# Altium footprint library iv_footprints.PcbLib: 724 footprints (part 41 of 46)
Each footprint in its own frame and in the unit in brackets; x right, y up, seen from the top. Pads: shape width x height; smd on the part's side, far side on the other; paste and mask are expansions set on the pad; w line width, h text height; cw(c..) or ccw(c..) is an arc to the next point about the centre after c.
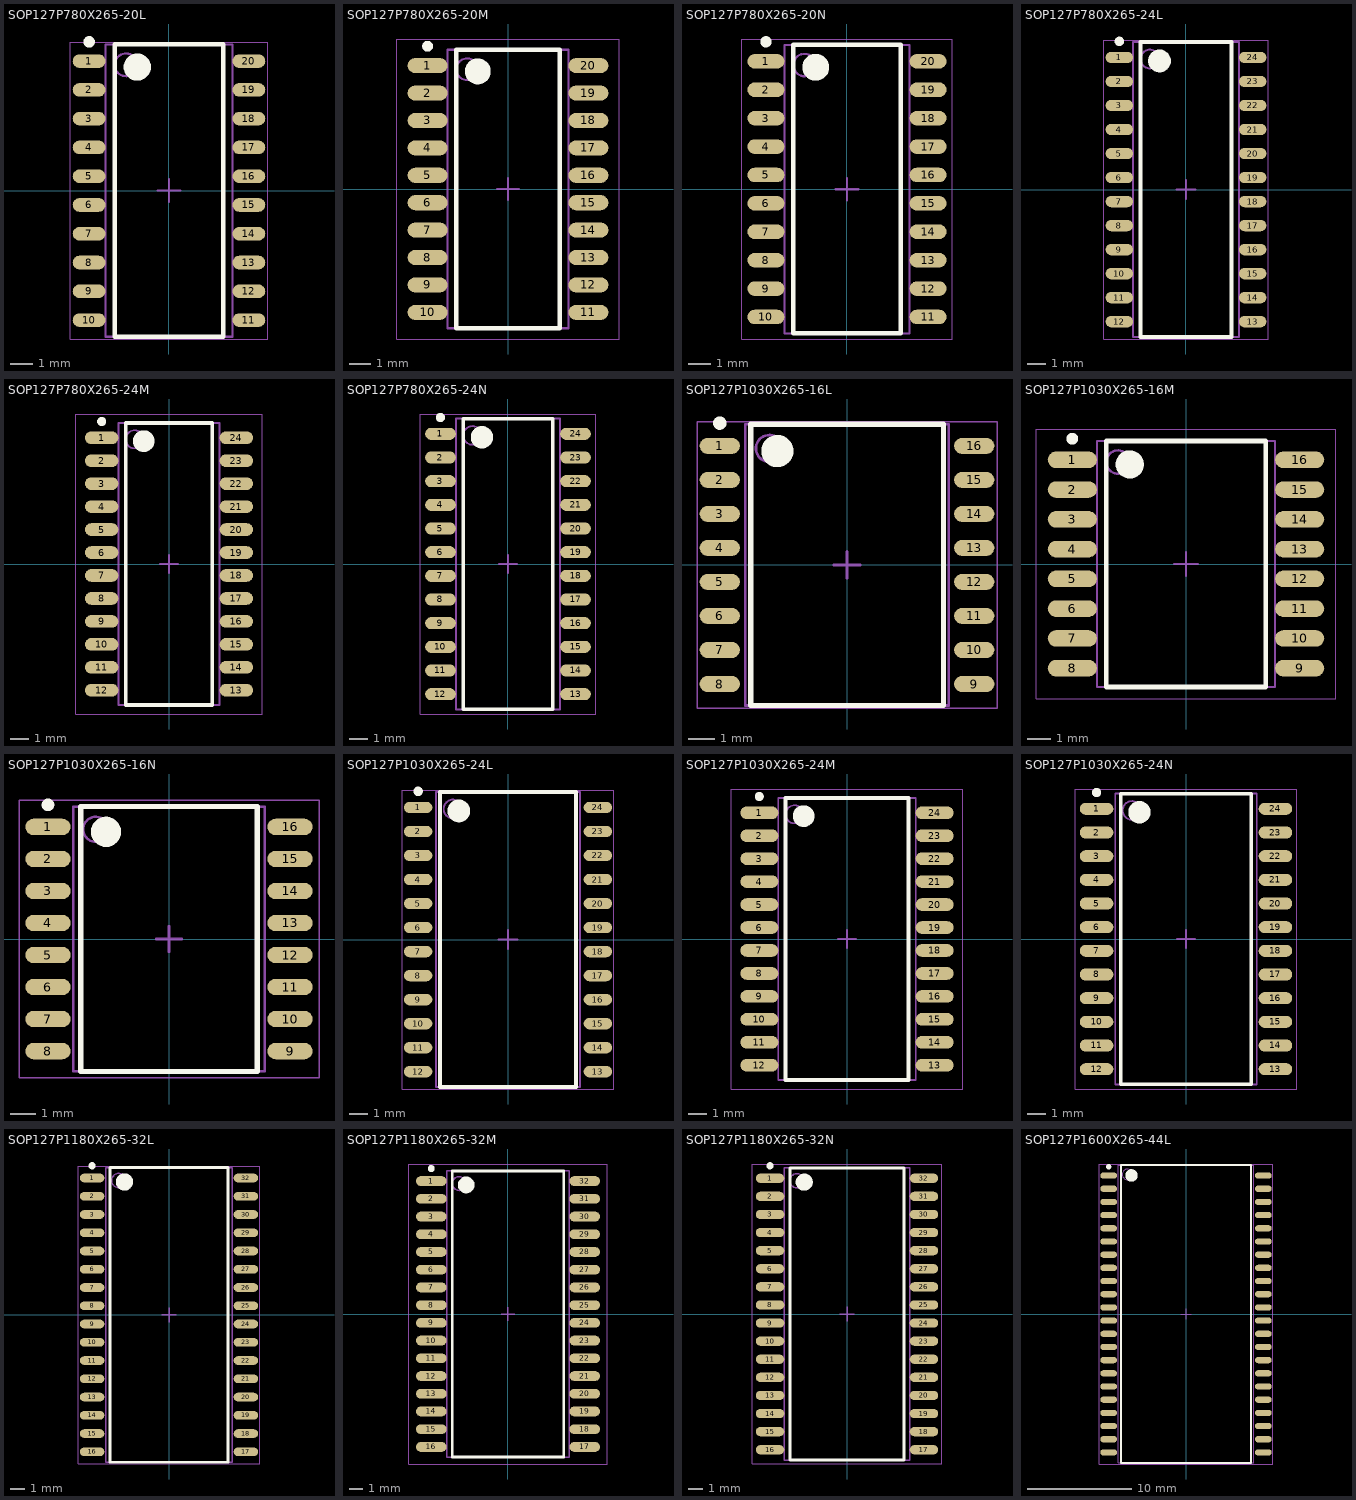
[diagram p40: the footprints below, top view; thin cyan lines are the x and y axes]

## SOP127P780X265-20L [mm] "SOP, 20-Leads, Body 12.70x5.40mm, Pitch 1.27mm, IPC High Density"
height 2.65
pads (20):
  oval 1.45x0.6 smd: 1(-3.525,5.715) 2(-3.525,4.445) 3(-3.525,3.175) 4(-3.525,1.905) 5(-3.525,0.635) 6(-3.525,-0.635) 7(-3.525,-1.905) 8(-3.525,-3.175) 9(-3.525,-4.445) 10(-3.525,-5.715) 11(3.525,-5.715) 12(3.525,-4.445) 13(3.525,-3.175) 14(3.525,-1.905) 15(3.525,-0.635) 16(3.525,0.635) 17(3.525,1.905) 18(3.525,3.175) 19(3.525,4.445) 20(3.525,5.715)
Top Overlay:
  circle w0.25: c-3.525,6.565 r0.125
  circle w0.6: c-1.4,5.45 r0.3
  lines w0.2: -2.4,-6.45 -2.4,6.45 2.4,6.45 2.4,-6.45 -2.4,-6.45
Mechanical 13:
  circle w0.1: c-1.9,5.55 r0.5
  lines w0.1: -2.8,-6.45 -2.8,6.45 2.8,6.45 2.8,-6.45 -2.8,-6.45
Mechanical 15:
  lines w0.05: -4.35,-6.55 -4.35,6.55 4.35,6.55 4.35,-6.55 -4.35,-6.55
  lines w0.1: -0.5,0 0.5,0 ; 0,-0.5 0,0.5
3D body "SOP127P780X265-20L.step": height 2.65, standoff 0, extent -3.9,-6.45 3.9,6.45

## SOP127P780X265-20M [mm] "SOP, 20-Leads, Body 12.70x5.40mm, Pitch 1.27mm, IPC Low Density"
height 2.65
pads (20):
  oval 1.85x0.7 smd: 1(-3.725,5.715) 2(-3.725,4.445) 3(-3.725,3.175) 4(-3.725,1.905) 5(-3.725,0.635) 6(-3.725,-0.635) 7(-3.725,-1.905) 8(-3.725,-3.175) 9(-3.725,-4.445) 10(-3.725,-5.715) 11(3.725,-5.715) 12(3.725,-4.445) 13(3.725,-3.175) 14(3.725,-1.905) 15(3.725,-0.635) 16(3.725,0.635) 17(3.725,1.905) 18(3.725,3.175) 19(3.725,4.445) 20(3.725,5.715)
Top Overlay:
  circle w0.25: c-3.725,6.615 r0.125
  circle w0.6: c-1.4,5.45 r0.3
  lines w0.2: -2.4,-6.45 -2.4,6.45 2.4,6.45 2.4,-6.45 -2.4,-6.45
Mechanical 13:
  circle w0.1: c-1.9,5.55 r0.5
  lines w0.1: -2.8,-6.45 -2.8,6.45 2.8,6.45 2.8,-6.45 -2.8,-6.45
Mechanical 15:
  lines w0.05: -5.15,-6.95 -5.15,6.95 5.15,6.95 5.15,-6.95 -5.15,-6.95
  lines w0.1: -0.5,0 0.5,0 ; 0,-0.5 0,0.5
3D body "SOP127P780X265-20M.step": height 2.65, standoff 0, extent -3.9,-6.45 3.9,6.45

## SOP127P780X265-20N [mm] "SOP, 20-Leads, Body 12.70x5.40mm, Pitch 1.27mm, IPC Medium Density"
height 2.65
pads (20):
  oval 1.65x0.65 smd: 1(-3.625,5.715) 2(-3.625,4.445) 3(-3.625,3.175) 4(-3.625,1.905) 5(-3.625,0.635) 6(-3.625,-0.635) 7(-3.625,-1.905) 8(-3.625,-3.175) 9(-3.625,-4.445) 10(-3.625,-5.715) 11(3.625,-5.715) 12(3.625,-4.445) 13(3.625,-3.175) 14(3.625,-1.905) 15(3.625,-0.635) 16(3.625,0.635) 17(3.625,1.905) 18(3.625,3.175) 19(3.625,4.445) 20(3.625,5.715)
Top Overlay:
  circle w0.25: c-3.625,6.59 r0.125
  circle w0.6: c-1.4,5.45 r0.3
  lines w0.2: -2.4,-6.45 -2.4,6.45 2.4,6.45 2.4,-6.45 -2.4,-6.45
Mechanical 13:
  circle w0.1: c-1.9,5.55 r0.5
  lines w0.1: -2.8,-6.45 -2.8,6.45 2.8,6.45 2.8,-6.45 -2.8,-6.45
Mechanical 15:
  lines w0.05: -4.7,-6.7 -4.7,6.7 4.7,6.7 4.7,-6.7 -4.7,-6.7
  lines w0.1: -0.5,0 0.5,0 ; 0,-0.5 0,0.5
3D body "SOP127P780X265-20N.step": height 2.65, standoff 0, extent -3.9,-6.45 3.9,6.45

## SOP127P780X265-24L [mm] "SOP, 24-Leads, Body 15.40x5.40mm, Pitch 1.27mm, IPC High Density"
height 2.65
pads (24):
  oval 1.45x0.6 smd: 1(-3.525,6.985) 2(-3.525,5.715) 3(-3.525,4.445) 4(-3.525,3.175) 5(-3.525,1.905) 6(-3.525,0.635) 7(-3.525,-0.635) 8(-3.525,-1.905) 9(-3.525,-3.175) 10(-3.525,-4.445) 11(-3.525,-5.715) 12(-3.525,-6.985) 13(3.525,-6.985) 14(3.525,-5.715) 15(3.525,-4.445) 16(3.525,-3.175) 17(3.525,-1.905) 18(3.525,-0.635) 19(3.525,0.635) 20(3.525,1.905) 21(3.525,3.175) 22(3.525,4.445) 23(3.525,5.715) 24(3.525,6.985)
Top Overlay:
  circle w0.25: c-3.525,7.835 r0.125
  circle w0.6: c-1.4,6.8 r0.3
  lines w0.2: -2.4,-7.8 -2.4,7.8 2.4,7.8 2.4,-7.8 -2.4,-7.8
Mechanical 13:
  circle w0.1: c-1.9,6.9 r0.5
  lines w0.1: -2.8,-7.8 -2.8,7.8 2.8,7.8 2.8,-7.8 -2.8,-7.8
Mechanical 15:
  lines w0.05: -4.35,-7.9 -4.35,7.9 4.35,7.9 4.35,-7.9 -4.35,-7.9
  lines w0.1: -0.5,0 0.5,0 ; 0,-0.5 0,0.5
3D body "SOP127P780X265-24L.step": height 2.65, standoff 0, extent -3.9,-7.8 3.9,7.8

## SOP127P780X265-24M [mm] "SOP, 24-Leads, Body 15.40x5.40mm, Pitch 1.27mm, IPC Low Density"
height 2.65
pads (24):
  oval 1.85x0.7 smd: 1(-3.725,6.985) 2(-3.725,5.715) 3(-3.725,4.445) 4(-3.725,3.175) 5(-3.725,1.905) 6(-3.725,0.635) 7(-3.725,-0.635) 8(-3.725,-1.905) 9(-3.725,-3.175) 10(-3.725,-4.445) 11(-3.725,-5.715) 12(-3.725,-6.985) 13(3.725,-6.985) 14(3.725,-5.715) 15(3.725,-4.445) 16(3.725,-3.175) 17(3.725,-1.905) 18(3.725,-0.635) 19(3.725,0.635) 20(3.725,1.905) 21(3.725,3.175) 22(3.725,4.445) 23(3.725,5.715) 24(3.725,6.985)
Top Overlay:
  circle w0.25: c-3.725,7.885 r0.125
  circle w0.6: c-1.4,6.8 r0.3
  lines w0.2: -2.4,-7.8 -2.4,7.8 2.4,7.8 2.4,-7.8 -2.4,-7.8
Mechanical 13:
  circle w0.1: c-1.9,6.9 r0.5
  lines w0.1: -2.8,-7.8 -2.8,7.8 2.8,7.8 2.8,-7.8 -2.8,-7.8
Mechanical 15:
  lines w0.05: -5.15,-8.3 -5.15,8.3 5.15,8.3 5.15,-8.3 -5.15,-8.3
  lines w0.1: -0.5,0 0.5,0 ; 0,-0.5 0,0.5
3D body "SOP127P780X265-24M.step": height 2.65, standoff 0, extent -3.9,-7.8 3.9,7.8

## SOP127P780X265-24N [mm] "SOP, 24-Leads, Body 15.40x5.40mm, Pitch 1.27mm, IPC Medium Density"
height 2.65
pads (24):
  oval 1.65x0.65 smd: 1(-3.625,6.985) 2(-3.625,5.715) 3(-3.625,4.445) 4(-3.625,3.175) 5(-3.625,1.905) 6(-3.625,0.635) 7(-3.625,-0.635) 8(-3.625,-1.905) 9(-3.625,-3.175) 10(-3.625,-4.445) 11(-3.625,-5.715) 12(-3.625,-6.985) 13(3.625,-6.985) 14(3.625,-5.715) 15(3.625,-4.445) 16(3.625,-3.175) 17(3.625,-1.905) 18(3.625,-0.635) 19(3.625,0.635) 20(3.625,1.905) 21(3.625,3.175) 22(3.625,4.445) 23(3.625,5.715) 24(3.625,6.985)
Top Overlay:
  circle w0.25: c-3.625,7.86 r0.125
  circle w0.6: c-1.4,6.8 r0.3
  lines w0.2: -2.4,-7.8 -2.4,7.8 2.4,7.8 2.4,-7.8 -2.4,-7.8
Mechanical 13:
  circle w0.1: c-1.9,6.9 r0.5
  lines w0.1: -2.8,-7.8 -2.8,7.8 2.8,7.8 2.8,-7.8 -2.8,-7.8
Mechanical 15:
  lines w0.05: -4.7,-8.05 -4.7,8.05 4.7,8.05 4.7,-8.05 -4.7,-8.05
  lines w0.1: -0.5,0 0.5,0 ; 0,-0.5 0,0.5
3D body "SOP127P780X265-24N.step": height 2.65, standoff 0, extent -3.9,-7.8 3.9,7.8

## SOP127P1030X265-16L [mm] "SOP, 16-Leads, Body 10.30x7.50mm, Pitch 1.27mm, IPC High Density"
height 2.65
pads (16):
  oval 1.5x0.6 smd: 1(-4.75,4.445) 2(-4.75,3.175) 3(-4.75,1.905) 4(-4.75,0.635) 5(-4.75,-0.635) 6(-4.75,-1.905) 7(-4.75,-3.175) 8(-4.75,-4.445) 9(4.75,-4.445) 10(4.75,-3.175) 11(4.75,-1.905) 12(4.75,-0.635) 13(4.75,0.635) 14(4.75,1.905) 15(4.75,3.175) 16(4.75,4.445)
Top Overlay:
  circle w0.25: c-4.75,5.295 r0.125
  circle w0.6: c-2.6,4.25 r0.3
  lines w0.2: -3.6,-5.25 -3.6,5.25 3.6,5.25 3.6,-5.25 -3.6,-5.25
Mechanical 13:
  circle w0.1: c-2.9,4.35 r0.5
  lines w0.1: -3.8,-5.25 -3.8,5.25 3.8,5.25 3.8,-5.25 -3.8,-5.25
Mechanical 15:
  lines w0.05: -5.6,-5.35 -5.6,5.35 5.6,5.35 5.6,-5.35 -5.6,-5.35
  lines w0.1: -0.5,0 0.5,0 ; 0,-0.5 0,0.5
3D body "SOP127P1030X265-16L.step": height 2.65, standoff 0, extent -5.15,-5.25 5.15,5.25

## SOP127P1030X265-16M [mm] "SOP, 16-Leads, Body 10.30x7.50mm, Pitch 1.27mm, IPC Low Density"
height 2.65
pads (16):
  oval 2.1x0.7 smd: 1(-4.85,4.445) 2(-4.85,3.175) 3(-4.85,1.905) 4(-4.85,0.635) 5(-4.85,-0.635) 6(-4.85,-1.905) 7(-4.85,-3.175) 8(-4.85,-4.445) 9(4.85,-4.445) 10(4.85,-3.175) 11(4.85,-1.905) 12(4.85,-0.635) 13(4.85,0.635) 14(4.85,1.905) 15(4.85,3.175) 16(4.85,4.445)
Top Overlay:
  circle w0.25: c-4.85,5.345 r0.125
  circle w0.6: c-2.4,4.25 r0.3
  lines w0.2: -3.4,-5.25 -3.4,5.25 3.4,5.25 3.4,-5.25 -3.4,-5.25
Mechanical 13:
  circle w0.1: c-2.9,4.35 r0.5
  lines w0.1: -3.8,-5.25 -3.8,5.25 3.8,5.25 3.8,-5.25 -3.8,-5.25
Mechanical 15:
  lines w0.05: -6.4,-5.75 -6.4,5.75 6.4,5.75 6.4,-5.75 -6.4,-5.75
  lines w0.1: -0.5,0 0.5,0 ; 0,-0.5 0,0.5
3D body "SOP127P1030X265-16M.step": height 2.65, standoff 0, extent -5.15,-5.25 5.15,5.25

## SOP127P1030X265-16N [mm] "SOP, 16-Leads, Body 10.30x7.50mm, Pitch 1.27mm, IPC Medium Density"
height 2.65
pads (16):
  oval 1.8x0.65 smd: 1(-4.8,4.445) 2(-4.8,3.175) 3(-4.8,1.905) 4(-4.8,0.635) 5(-4.8,-0.635) 6(-4.8,-1.905) 7(-4.8,-3.175) 8(-4.8,-4.445) 9(4.8,-4.445) 10(4.8,-3.175) 11(4.8,-1.905) 12(4.8,-0.635) 13(4.8,0.635) 14(4.8,1.905) 15(4.8,3.175) 16(4.8,4.445)
Top Overlay:
  circle w0.25: c-4.8,5.32 r0.125
  circle w0.6: c-2.5,4.25 r0.3
  lines w0.2: -3.5,-5.25 -3.5,5.25 3.5,5.25 3.5,-5.25 -3.5,-5.25
Mechanical 13:
  circle w0.1: c-2.9,4.35 r0.5
  lines w0.1: -3.8,-5.25 -3.8,5.25 3.8,5.25 3.8,-5.25 -3.8,-5.25
Mechanical 15:
  lines w0.05: -5.95,-5.5 -5.95,5.5 5.95,5.5 5.95,-5.5 -5.95,-5.5
  lines w0.1: -0.5,0 0.5,0 ; 0,-0.5 0,0.5
3D body "SOP127P1030X265-16N.step": height 2.65, standoff 0, extent -5.15,-5.25 5.15,5.25

## SOP127P1030X265-24L [mm] "SOP, 24-Leads, Body 15.40x7.50mm, Pitch 1.27mm, IPC High Density"
height 2.65
pads (24):
  oval 1.5x0.6 smd: 1(-4.75,6.985) 2(-4.75,5.715) 3(-4.75,4.445) 4(-4.75,3.175) 5(-4.75,1.905) 6(-4.75,0.635) 7(-4.75,-0.635) 8(-4.75,-1.905) 9(-4.75,-3.175) 10(-4.75,-4.445) 11(-4.75,-5.715) 12(-4.75,-6.985) 13(4.75,-6.985) 14(4.75,-5.715) 15(4.75,-4.445) 16(4.75,-3.175) 17(4.75,-1.905) 18(4.75,-0.635) 19(4.75,0.635) 20(4.75,1.905) 21(4.75,3.175) 22(4.75,4.445) 23(4.75,5.715) 24(4.75,6.985)
Top Overlay:
  circle w0.25: c-4.75,7.835 r0.125
  circle w0.6: c-2.6,6.8 r0.3
  lines w0.2: -3.6,-7.8 -3.6,7.8 3.6,7.8 3.6,-7.8 -3.6,-7.8
Mechanical 13:
  circle w0.1: c-2.9,6.9 r0.5
  lines w0.1: -3.8,-7.8 -3.8,7.8 3.8,7.8 3.8,-7.8 -3.8,-7.8
Mechanical 15:
  lines w0.05: -5.6,-7.9 -5.6,7.9 5.6,7.9 5.6,-7.9 -5.6,-7.9
  lines w0.1: -0.5,0 0.5,0 ; 0,-0.5 0,0.5
3D body "SOP127P1030X265-24L.step": height 2.65, standoff 0, extent -5.15,-7.8 5.15,7.8

## SOP127P1030X265-24M [mm] "SOP, 24-Leads, Body 15.40x7.50mm, Pitch 1.27mm, IPC Low Density"
height 2.65
pads (24):
  oval 2.1x0.7 smd: 1(-4.85,6.985) 2(-4.85,5.715) 3(-4.85,4.445) 4(-4.85,3.175) 5(-4.85,1.905) 6(-4.85,0.635) 7(-4.85,-0.635) 8(-4.85,-1.905) 9(-4.85,-3.175) 10(-4.85,-4.445) 11(-4.85,-5.715) 12(-4.85,-6.985) 13(4.85,-6.985) 14(4.85,-5.715) 15(4.85,-4.445) 16(4.85,-3.175) 17(4.85,-1.905) 18(4.85,-0.635) 19(4.85,0.635) 20(4.85,1.905) 21(4.85,3.175) 22(4.85,4.445) 23(4.85,5.715) 24(4.85,6.985)
Top Overlay:
  circle w0.25: c-4.85,7.885 r0.125
  circle w0.6: c-2.4,6.8 r0.3
  lines w0.2: -3.4,-7.8 -3.4,7.8 3.4,7.8 3.4,-7.8 -3.4,-7.8
Mechanical 13:
  circle w0.1: c-2.9,6.9 r0.5
  lines w0.1: -3.8,-7.8 -3.8,7.8 3.8,7.8 3.8,-7.8 -3.8,-7.8
Mechanical 15:
  lines w0.05: -6.4,-8.3 -6.4,8.3 6.4,8.3 6.4,-8.3 -6.4,-8.3
  lines w0.1: -0.5,0 0.5,0 ; 0,-0.5 0,0.5
3D body "SOP127P1030X265-24M.step": height 2.65, standoff 0, extent -5.15,-7.8 5.15,7.8

## SOP127P1030X265-24N [mm] "SOP, 24-Leads, Body 15.40x7.50mm, Pitch 1.27mm, IPC Medium Density"
height 2.65
pads (24):
  oval 1.8x0.65 smd: 1(-4.8,6.985) 2(-4.8,5.715) 3(-4.8,4.445) 4(-4.8,3.175) 5(-4.8,1.905) 6(-4.8,0.635) 7(-4.8,-0.635) 8(-4.8,-1.905) 9(-4.8,-3.175) 10(-4.8,-4.445) 11(-4.8,-5.715) 12(-4.8,-6.985) 13(4.8,-6.985) 14(4.8,-5.715) 15(4.8,-4.445) 16(4.8,-3.175) 17(4.8,-1.905) 18(4.8,-0.635) 19(4.8,0.635) 20(4.8,1.905) 21(4.8,3.175) 22(4.8,4.445) 23(4.8,5.715) 24(4.8,6.985)
Top Overlay:
  circle w0.25: c-4.8,7.86 r0.125
  circle w0.6: c-2.5,6.8 r0.3
  lines w0.2: -3.5,-7.8 -3.5,7.8 3.5,7.8 3.5,-7.8 -3.5,-7.8
Mechanical 13:
  circle w0.1: c-2.9,6.9 r0.5
  lines w0.1: -3.8,-7.8 -3.8,7.8 3.8,7.8 3.8,-7.8 -3.8,-7.8
Mechanical 15:
  lines w0.05: -5.95,-8.05 -5.95,8.05 5.95,8.05 5.95,-8.05 -5.95,-8.05
  lines w0.1: -0.5,0 0.5,0 ; 0,-0.5 0,0.5
3D body "SOP127P1030X265-24N.step": height 2.65, standoff 0, extent -5.15,-7.8 5.15,7.8

## SOP127P1180X265-32L [mm] "SOP, 32-Leads, Body 20.30x8.60mm, Pitch 1.27mm, IPC High Density"
height 2.65
pads (32):
  oval 1.7x0.6 smd: 1(-5.35,9.525) 2(-5.35,8.255) 3(-5.35,6.985) 4(-5.35,5.715) 5(-5.35,4.445) 6(-5.35,3.175) 7(-5.35,1.905) 8(-5.35,0.635) 9(-5.35,-0.635) 10(-5.35,-1.905) 11(-5.35,-3.175) 12(-5.35,-4.445) 13(-5.35,-5.715) 14(-5.35,-6.985) 15(-5.35,-8.255) 16(-5.35,-9.525) 17(5.35,-9.525) 18(5.35,-8.255) 19(5.35,-6.985) 20(5.35,-5.715) 21(5.35,-4.445) 22(5.35,-3.175) 23(5.35,-1.905) 24(5.35,-0.635) 25(5.35,0.635) 26(5.35,1.905) 27(5.35,3.175) 28(5.35,4.445) 29(5.35,5.715) 30(5.35,6.985) 31(5.35,8.255) 32(5.35,9.525)
Top Overlay:
  circle w0.25: c-5.35,10.375 r0.125
  circle w0.6: c-3.1,9.25 r0.3
  lines w0.2: -4.1,-10.25 -4.1,10.25 4.1,10.25 4.1,-10.25 -4.1,-10.25
Mechanical 13:
  circle w0.1: c-3.5,9.35 r0.5
  lines w0.1: -4.4,-10.25 -4.4,10.25 4.4,10.25 4.4,-10.25 -4.4,-10.25
Mechanical 15:
  lines w0.05: -6.3,-10.35 -6.3,10.35 6.3,10.35 6.3,-10.35 -6.3,-10.35
  lines w0.1: -0.5,0 0.5,0 ; 0,-0.5 0,0.5
3D body "SOP127P1180X265-32L.step": height 2.65, standoff 0, extent -5.9,-10.25 5.9,10.25

## SOP127P1180X265-32M [mm] "SOP, 32-Leads, Body 20.30x8.60mm, Pitch 1.27mm, IPC Low Density"
height 2.65
pads (32):
  oval 2.2x0.7 smd: 1(-5.5,9.525) 2(-5.5,8.255) 3(-5.5,6.985) 4(-5.5,5.715) 5(-5.5,4.445) 6(-5.5,3.175) 7(-5.5,1.905) 8(-5.5,0.635) 9(-5.5,-0.635) 10(-5.5,-1.905) 11(-5.5,-3.175) 12(-5.5,-4.445) 13(-5.5,-5.715) 14(-5.5,-6.985) 15(-5.5,-8.255) 16(-5.5,-9.525) 17(5.5,-9.525) 18(5.5,-8.255) 19(5.5,-6.985) 20(5.5,-5.715) 21(5.5,-4.445) 22(5.5,-3.175) 23(5.5,-1.905) 24(5.5,-0.635) 25(5.5,0.635) 26(5.5,1.905) 27(5.5,3.175) 28(5.5,4.445) 29(5.5,5.715) 30(5.5,6.985) 31(5.5,8.255) 32(5.5,9.525)
Top Overlay:
  circle w0.25: c-5.5,10.425 r0.125
  circle w0.6: c-3,9.25 r0.3
  lines w0.2: -4,-10.25 -4,10.25 4,10.25 4,-10.25 -4,-10.25
Mechanical 13:
  circle w0.1: c-3.5,9.35 r0.5
  lines w0.1: -4.4,-10.25 -4.4,10.25 4.4,10.25 4.4,-10.25 -4.4,-10.25
Mechanical 15:
  lines w0.05: -7.1,-10.75 -7.1,10.75 7.1,10.75 7.1,-10.75 -7.1,-10.75
  lines w0.1: -0.5,0 0.5,0 ; 0,-0.5 0,0.5
3D body "SOP127P1180X265-32M.step": height 2.65, standoff 0, extent -5.9,-10.25 5.9,10.25

## SOP127P1180X265-32N [mm] "SOP, 32-Leads, Body 20.30x8.60mm, Pitch 1.27mm, IPC Medium Density"
height 2.65
pads (32):
  oval 2x0.65 smd: 1(-5.4,9.525) 2(-5.4,8.255) 3(-5.4,6.985) 4(-5.4,5.715) 5(-5.4,4.445) 6(-5.4,3.175) 7(-5.4,1.905) 8(-5.4,0.635) 9(-5.4,-0.635) 10(-5.4,-1.905) 11(-5.4,-3.175) 12(-5.4,-4.445) 13(-5.4,-5.715) 14(-5.4,-6.985) 15(-5.4,-8.255) 16(-5.4,-9.525) 17(5.4,-9.525) 18(5.4,-8.255) 19(5.4,-6.985) 20(5.4,-5.715) 21(5.4,-4.445) 22(5.4,-3.175) 23(5.4,-1.905) 24(5.4,-0.635) 25(5.4,0.635) 26(5.4,1.905) 27(5.4,3.175) 28(5.4,4.445) 29(5.4,5.715) 30(5.4,6.985) 31(5.4,8.255) 32(5.4,9.525)
Top Overlay:
  circle w0.25: c-5.4,10.4 r0.125
  circle w0.6: c-3,9.25 r0.3
  lines w0.2: -4,-10.25 -4,10.25 4,10.25 4,-10.25 -4,-10.25
Mechanical 13:
  circle w0.1: c-3.5,9.35 r0.5
  lines w0.1: -4.4,-10.25 -4.4,10.25 4.4,10.25 4.4,-10.25 -4.4,-10.25
Mechanical 15:
  lines w0.05: -6.65,-10.5 -6.65,10.5 6.65,10.5 6.65,-10.5 -6.65,-10.5
  lines w0.1: -0.5,0 0.5,0 ; 0,-0.5 0,0.5
3D body "SOP127P1180X265-32N.step": height 2.65, standoff 0, extent -5.9,-10.25 5.9,10.25

## SOP127P1600X265-44L [mm] "SOP, 44-Leads, Body 28.45x13.00mm, Pitch 1.27mm, IPC High Density"
height 2.65
pads (44):
  oval 1.6x0.6 smd: 1(-7.45,13.335) 2(-7.45,12.065) 3(-7.45,10.795) 4(-7.45,9.525) 5(-7.45,8.255) 6(-7.45,6.985) 7(-7.45,5.715) 8(-7.45,4.445) 9(-7.45,3.175) 10(-7.45,1.905) 11(-7.45,0.635) 12(-7.45,-0.635) 13(-7.45,-1.905) 14(-7.45,-3.175) 15(-7.45,-4.445) 16(-7.45,-5.715) 17(-7.45,-6.985) 18(-7.45,-8.255) 19(-7.45,-9.525) 20(-7.45,-10.795) 21(-7.45,-12.065) 22(-7.45,-13.335) 23(7.45,-13.335) 24(7.45,-12.065) 25(7.45,-10.795) 26(7.45,-9.525) 27(7.45,-8.255) 28(7.45,-6.985) 29(7.45,-5.715) 30(7.45,-4.445) 31(7.45,-3.175) 32(7.45,-1.905) 33(7.45,-0.635) 34(7.45,0.635) 35(7.45,1.905) 36(7.45,3.175) 37(7.45,4.445) 38(7.45,5.715) 39(7.45,6.985) 40(7.45,8.255) 41(7.45,9.525) 42(7.45,10.795) 43(7.45,12.065) 44(7.45,13.335)
Top Overlay:
  circle w0.25: c-7.45,14.185 r0.125
  circle w0.6: c-5.25,13.35 r0.3
  lines w0.2: -6.25,-14.35 -6.25,14.35 6.25,14.35 6.25,-14.35 -6.25,-14.35
Mechanical 13:
  circle w0.1: c-5.65,13.45 r0.5
  lines w0.1: -6.55,-14.35 -6.55,14.35 6.55,14.35 6.55,-14.35 -6.55,-14.35
Mechanical 15:
  lines w0.05: -8.35,-14.45 -8.35,14.45 8.35,14.45 8.35,-14.45 -8.35,-14.45
  lines w0.1: -0.5,0 0.5,0 ; 0,-0.5 0,0.5
3D body "SOP127P1600X265-44L.step": height 2.65, standoff 0, extent -8,-14.35 8,14.35